# Altium footprint library PcbLib_ICs.PcbLib: 317 footprints (part 14 of 24)
Each footprint in its own frame and in the unit in brackets; x right, y up, seen from the top. Pads: shape width x height; smd on the part's side, far side on the other; paste and mask are expansions set on the pad; w line width, h text height; cw(c..) or ccw(c..) is an arc to the next point about the centre after c.
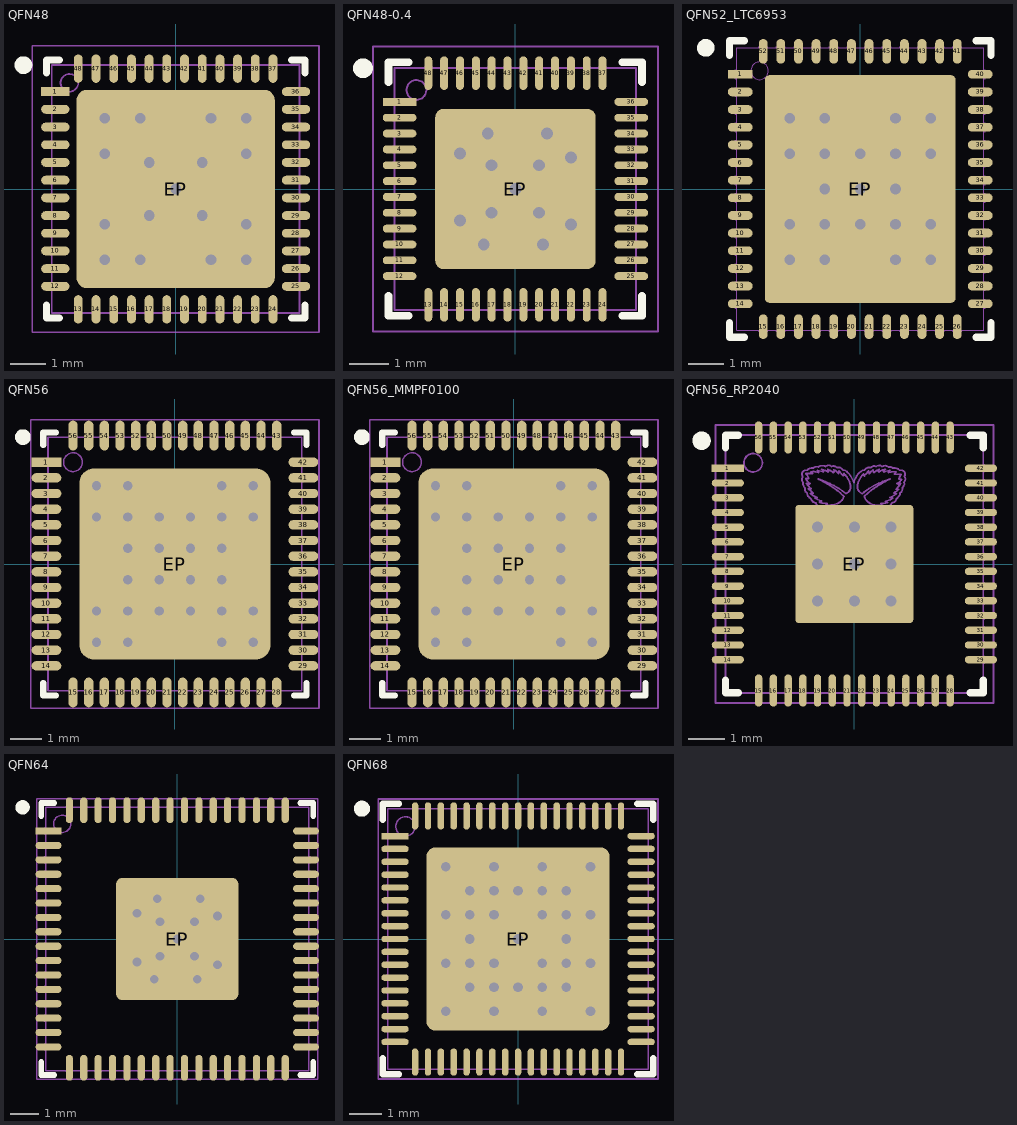
[diagram p13: the footprints below, top view; thin cyan lines are the x and y axes]

## QFN48 [mm] "QFN, 48-Leads, Body 6.95x6.95mm, Pitch 0.50mm, Thermal Pad 5.60x5.60mm, IPC Medium Density"
height 0.55
pads (49):
  rect 0.8x0.25 smd paste+0 mask+0.075: 1(-3.4,2.75)
  oval 0.8x0.25 smd paste+0 mask+0.075: 2(-3.4,2.25) 3(-3.4,1.75) 4(-3.4,1.25) 5(-3.4,0.75) 6(-3.4,0.25) 7(-3.4,-0.25) 8(-3.4,-0.75) 9(-3.4,-1.25) 10(-3.4,-1.75) 11(-3.4,-2.25) 12(-3.4,-2.75) 25(3.4,-2.75) 26(3.4,-2.25) 27(3.4,-1.75) 28(3.4,-1.25) 29(3.4,-0.75) 30(3.4,-0.25) 31(3.4,0.25) 32(3.4,0.75) 33(3.4,1.25) 34(3.4,1.75) 35(3.4,2.25) 36(3.4,2.75)
  oval 0.25x0.8 smd paste+0 mask+0.075: 13(-2.75,-3.4) 14(-2.25,-3.4) 15(-1.75,-3.4) 16(-1.25,-3.4) 17(-0.75,-3.4) 18(-0.25,-3.4) 19(0.25,-3.4) 20(0.75,-3.4) 21(1.25,-3.4) 22(1.75,-3.4) 23(2.25,-3.4) 24(2.75,-3.4) 37(2.75,3.4) 38(2.25,3.4) 39(1.75,3.4) 40(1.25,3.4) 41(0.75,3.4) 42(0.25,3.4) 43(-0.25,3.4) 44(-0.75,3.4) 45(-1.25,3.4) 46(-1.75,3.4) 47(-2.25,3.4) 48(-2.75,3.4)
  rrect10% 5.6x5.6 smd paste-50 mask+0.075: EP(0,0)
via -2,-1 diameter 0.7 hole 0.3
via -1,-2 diameter 0.7 hole 0.3
via 1,-2 diameter 0.7 hole 0.3
via 2,-1 diameter 0.7 hole 0.3
via 2,1 diameter 0.7 hole 0.3
via 1,2 diameter 0.7 hole 0.3
via -2,1 diameter 0.7 hole 0.3
via -1,2 diameter 0.7 hole 0.3
via 2,-2 diameter 0.7 hole 0.3
via 0.75,-0.75 diameter 0.7 hole 0.3
via -2,-2 diameter 0.7 hole 0.3
via -0.75,-0.75 diameter 0.7 hole 0.3
via -2,2 diameter 0.7 hole 0.3
via 0.75,0.75 diameter 0.7 hole 0.3
via 2,2 diameter 0.7 hole 0.3
via 0,0 diameter 0.7 hole 0.3
via -0.75,0.75 diameter 0.7 hole 0.3
Top Overlay:
  circle w0.25: c-4.3,3.5 r0.125
  lines w0.2: -3.65,-3.275 -3.65,-3.65 -3.275,-3.65 ; -3.65,3.275 -3.65,3.65 -3.275,3.65 ; 3.275,-3.65 3.65,-3.65 3.65,-3.275 ; 3.275,3.65 3.65,3.65 3.65,3.275
Top Paste:
  region: -2.2,-2.7 -2.2,-2.2 -2.7,-2.2 -2.7,-2.7
  region: -1.5,-2.7 -1.5,-2.2 -2,-2.2 -2,-2.7
  region: -0.8,-2.7 -0.8,-2.2 -1.3,-2.2 -1.3,-2.7
  region: 2.7,-2.7 2.7,-2.2 2.2,-2.2 2.2,-2.7
  region: 1.3,-2.7 1.3,-2.2 0.8,-2.2 0.8,-2.7
  region: 2,-2.7 2,-2.2 1.5,-2.2 1.5,-2.7
  region: -0.1,-2.7 -0.1,-2.2 -0.6,-2.2 -0.6,-2.7
  region: 0.6,-2.7 0.6,-2.2 0.1,-2.2 0.1,-2.7
  region: -2.2,-2 -2.2,-1.5 -2.7,-1.5 -2.7,-2
  region: -1.5,-2 -1.5,-1.5 -2,-1.5 -2,-2
  region: -0.8,-2 -0.8,-1.5 -1.3,-1.5 -1.3,-2
  region: 2.7,-2 2.7,-1.5 2.2,-1.5 2.2,-2
  region: 1.3,-2 1.3,-1.5 0.8,-1.5 0.8,-2
  region: 2,-2 2,-1.5 1.5,-1.5 1.5,-2
  region: -0.1,-2 -0.1,-1.5 -0.6,-1.5 -0.6,-2
  region: 0.6,-2 0.6,-1.5 0.1,-1.5 0.1,-2
  region: -2.2,-1.3 -2.2,-0.8 -2.7,-0.8 -2.7,-1.3
  region: -1.5,-1.3 -1.5,-0.8 -2,-0.8 -2,-1.3
  region: -0.8,-1.3 -0.8,-0.8 -1.3,-0.8 -1.3,-1.3
  region: 2.7,-1.3 2.7,-0.8 2.2,-0.8 2.2,-1.3
  region: 1.3,-1.3 1.3,-0.8 0.8,-0.8 0.8,-1.3
  region: 2,-1.3 2,-0.8 1.5,-0.8 1.5,-1.3
  region: -0.1,-1.3 -0.1,-0.8 -0.6,-0.8 -0.6,-1.3
  region: 0.6,-1.3 0.6,-0.8 0.1,-0.8 0.1,-1.3
  region: 2.2,2.7 2.2,2.2 2.7,2.2 2.7,2.7
  region: 1.5,2.7 1.5,2.2 2,2.2 2,2.7
  region: 0.8,2.7 0.8,2.2 1.3,2.2 1.3,2.7
  region: -2.7,2.7 -2.7,2.2 -2.2,2.2 -2.2,2.7
  region: -1.3,2.7 -1.3,2.2 -0.8,2.2 -0.8,2.7
  region: -2,2.7 -2,2.2 -1.5,2.2 -1.5,2.7
  region: 0.1,2.7 0.1,2.2 0.6,2.2 0.6,2.7
  region: -0.6,2.7 -0.6,2.2 -0.1,2.2 -0.1,2.7
  region: 2.2,2 2.2,1.5 2.7,1.5 2.7,2
  region: 1.5,2 1.5,1.5 2,1.5 2,2
  region: 0.8,2 0.8,1.5 1.3,1.5 1.3,2
  region: -2.7,2 -2.7,1.5 -2.2,1.5 -2.2,2
  region: -1.3,2 -1.3,1.5 -0.8,1.5 -0.8,2
  region: -2,2 -2,1.5 -1.5,1.5 -1.5,2
  region: 0.1,2 0.1,1.5 0.6,1.5 0.6,2
  region: -0.6,2 -0.6,1.5 -0.1,1.5 -0.1,2
  region: 2.2,1.3 2.2,0.8 2.7,0.8 2.7,1.3
  region: 1.5,1.3 1.5,0.8 2,0.8 2,1.3
  region: 0.8,1.3 0.8,0.8 1.3,0.8 1.3,1.3
  region: -2.7,1.3 -2.7,0.8 -2.2,0.8 -2.2,1.3
  region: -1.3,1.3 -1.3,0.8 -0.8,0.8 -0.8,1.3
  region: -2,1.3 -2,0.8 -1.5,0.8 -1.5,1.3
  region: 0.1,1.3 0.1,0.8 0.6,0.8 0.6,1.3
  region: -0.6,1.3 -0.6,0.8 -0.1,0.8 -0.1,1.3
  region: 2.7,-0.6 2.7,-0.1 2.2,-0.1 2.2,-0.6
  region: 2.2,0.6 2.2,0.1 2.7,0.1 2.7,0.6
  region: 2,-0.6 2,-0.1 1.5,-0.1 1.5,-0.6
  region: 1.5,0.6 1.5,0.1 2,0.1 2,0.6
  region: 1.3,-0.6 1.3,-0.1 0.8,-0.1 0.8,-0.6
  region: 0.8,0.6 0.8,0.1 1.3,0.1 1.3,0.6
  region: -2.7,0.6 -2.7,0.1 -2.2,0.1 -2.2,0.6
  region: -2.2,-0.6 -2.2,-0.1 -2.7,-0.1 -2.7,-0.6
  region: -1.3,0.6 -1.3,0.1 -0.8,0.1 -0.8,0.6
  region: -2,0.6 -2,0.1 -1.5,0.1 -1.5,0.6
  region: -1.5,-0.6 -1.5,-0.1 -2,-0.1 -2,-0.6
  region: -0.8,-0.6 -0.8,-0.1 -1.3,-0.1 -1.3,-0.6
  region: 0.1,0.6 0.1,0.1 0.6,0.1 0.6,0.6
  region: -0.6,0.6 -0.6,0.1 -0.1,0.1 -0.1,0.6
  region: -0.1,-0.6 -0.1,-0.1 -0.6,-0.1 -0.6,-0.6
  region: 0.6,-0.6 0.6,-0.1 0.1,-0.1 0.1,-0.6
Bottom Solder:
  region: -3,3 -0.75,3 0,2.25 0.75,3 3,3 3,0.75 2.25,0 3,-0.75 3,-3 0.75,-3 0,-2.25 -0.75,-3 -3,-3 -3,-0.75 -2.25,0 -3,0.75
Top Assy:
  circle w0.05: c-3,3 r0.25
  lines w0.05: -3.517,-2.85 -3.54,-2.85 -3.54,-2.65 -3.517,-2.65 ; -3.517,-2.35 -3.54,-2.35 -3.54,-2.15 -3.517,-2.15 ; -3.517,-1.85 -3.54,-1.85 -3.54,-1.65 -3.517,-1.65 ; -3.517,-1.35 -3.54,-1.35 -3.54,-1.15 -3.517,-1.15 ; -3.517,-0.85 -3.54,-0.85 -3.54,-0.65 -3.517,-0.65 ; -3.517,-0.35 -3.54,-0.35 -3.54,-0.15 -3.517,-0.15 ; -3.517,0.15 -3.54,0.15 -3.54,0.35 -3.517,0.35 ; -3.517,0.65 -3.54,0.65 -3.54,0.85 -3.517,0.85 ; -3.517,1.15 -3.54,1.15 -3.54,1.35 -3.517,1.35 ; -3.517,1.65 -3.54,1.65 -3.54,1.85 -3.517,1.85 ; -3.517,2.15 -3.54,2.15 -3.54,2.35 -3.517,2.35 ; -3.517,2.65 -3.54,2.65 -3.54,2.85 -3.517,2.85 ; -2.85,-3.517 -2.85,-3.54 -2.65,-3.54 -2.65,-3.517 ; -2.85,3.517 -2.85,3.54 -2.65,3.54 -2.65,3.517 ; -2.35,-3.517 -2.35,-3.54 -2.15,-3.54 -2.15,-3.517 ; -2.35,3.517 -2.35,3.54 -2.15,3.54 -2.15,3.517 ; -1.85,-3.517 -1.85,-3.54 -1.65,-3.54 -1.65,-3.517 ; -1.85,3.517 -1.85,3.54 -1.65,3.54 -1.65,3.517 ; -1.35,-3.517 -1.35,-3.54 -1.15,-3.54 -1.15,-3.517 ; -1.35,3.517 -1.35,3.54 -1.15,3.54 -1.15,3.517 ; -0.85,-3.517 -0.85,-3.54 -0.65,-3.54 -0.65,-3.517 ; -0.85,3.517 -0.85,3.54 -0.65,3.54 -0.65,3.517 ; -0.35,-3.517 -0.35,-3.54 -0.15,-3.54 -0.15,-3.517 ; -0.35,3.517 -0.35,3.54 -0.15,3.54 -0.15,3.517 ; 0.15,-3.517 0.15,-3.54 0.35,-3.54 0.35,-3.517 ; 0.15,3.517 0.15,3.54 0.35,3.54 0.35,3.517 ; 0.65,-3.517 0.65,-3.54 0.85,-3.54 0.85,-3.517 ; 0.65,3.517 0.65,3.54 0.85,3.54 0.85,3.517 ; 1.15,-3.517 1.15,-3.54 1.35,-3.54 1.35,-3.517 ; 1.15,3.517 1.15,3.54 1.35,3.54 1.35,3.517 ; 1.65,-3.517 1.65,-3.54 1.85,-3.54 1.85,-3.517 ; 1.65,3.517 1.65,3.54 1.85,3.54 1.85,3.517 ; 2.15,-3.517 2.15,-3.54 2.35,-3.54 2.35,-3.517 ; 2.15,3.517 2.15,3.54 2.35,3.54 2.35,3.517 ; 2.65,-3.517 2.65,-3.54 2.85,-3.54 2.85,-3.517 ; 2.65,3.517 2.65,3.54 2.85,3.54 2.85,3.517 ; 3.517,-2.85 3.54,-2.85 3.54,-2.65 3.517,-2.65 ; 3.517,-2.35 3.54,-2.35 3.54,-2.15 3.517,-2.15 ; 3.517,-1.85 3.54,-1.85 3.54,-1.65 3.517,-1.65 ; 3.517,-1.35 3.54,-1.35 3.54,-1.15 3.517,-1.15 ; 3.517,-0.85 3.54,-0.85 3.54,-0.65 3.517,-0.65 ; 3.517,-0.35 3.54,-0.35 3.54,-0.15 3.517,-0.15 ; 3.517,0.15 3.54,0.15 3.54,0.35 3.517,0.35 ; 3.517,0.65 3.54,0.65 3.54,0.85 3.517,0.85 ; 3.517,1.15 3.54,1.15 3.54,1.35 3.517,1.35 ; 3.517,1.65 3.54,1.65 3.54,1.85 3.517,1.85 ; 3.517,2.15 3.54,2.15 3.54,2.35 3.517,2.35 ; 3.517,2.65 3.54,2.65 3.54,2.85 3.517,2.85 ; -3.5,-3.5 3.5,-3.5 3.5,3.5 -3.5,3.5 -3.5,-3.5
  text ".Designator" at -3.443,-0.467 h2
Top Text:
  lines w0.05: -4.05,-4.05 4.05,-4.05 4.05,4.05 -4.05,4.05 -4.05,-4.05
  lines w0.1: -0.5,0 0.5,0 ; 0,-0.5 0,0.5
3D body "QFN50P695X695X55_HS-49N.step": height 0.55, standoff 0, extent -3.52,-3.52 3.52,3.52

## QFN48-0.4 [mm] "QFN48 package 6x6 mm with 0.4mm pitch"
height 1
pads (49):
  rect 0.85x0.2 smd paste+0 mask+0.05: 1(-2.925,2.2)
  oval 0.85x0.2 smd paste+0 mask+0.05: 2(-2.925,1.8) 3(-2.925,1.4) 4(-2.925,1) 5(-2.925,0.6) 6(-2.925,0.2) 7(-2.925,-0.2) 8(-2.925,-0.6) 9(-2.925,-1) 10(-2.925,-1.4) 11(-2.925,-1.8) 12(-2.925,-2.2) 25(2.925,-2.2) 26(2.925,-1.8) 27(2.925,-1.4) 28(2.925,-1) 29(2.925,-0.6) 30(2.925,-0.2) 31(2.925,0.2) 32(2.925,0.6) 33(2.925,1) 34(2.925,1.4) 35(2.925,1.8) 36(2.925,2.2)
  oval 0.2x0.85 smd paste+0 mask+0.05: 13(-2.2,-2.925) 14(-1.8,-2.925) 15(-1.4,-2.925) 16(-1,-2.925) 17(-0.6,-2.925) 18(-0.2,-2.925) 19(0.2,-2.925) 20(0.6,-2.925) 21(1,-2.925) 22(1.4,-2.925) 23(1.8,-2.925) 24(2.2,-2.925) 37(2.2,2.925) 38(1.8,2.925) 39(1.4,2.925) 40(1,2.925) 41(0.6,2.925) 42(0.2,2.925) 43(-0.2,2.925) 44(-0.6,2.925) 45(-1,2.925) 46(-1.4,2.925) 47(-1.8,2.925) 48(-2.2,2.925)
  rrect10% 4.05x4.05 smd paste-50 mask+0.05: EP(0,0)
via 0,0 diameter 0.7 hole 0.3
via -0.6,0.6 diameter 0.7 hole 0.3
via 0.6,0.6 diameter 0.7 hole 0.3
via 0.8,1.4 diameter 0.7 hole 0.3
via 1.4,0.8 diameter 0.7 hole 0.3
via -0.7,1.4 diameter 0.7 hole 0.3
via -1.4,0.9 diameter 0.7 hole 0.3
via 1.4,-0.9 diameter 0.7 hole 0.3
via 0.7,-1.4 diameter 0.7 hole 0.3
via -1.4,-0.8 diameter 0.7 hole 0.3
via -0.8,-1.4 diameter 0.7 hole 0.3
via -0.6,-0.6 diameter 0.7 hole 0.3
via 0.6,-0.6 diameter 0.7 hole 0.3
Top Overlay:
  circle w0.25: c-3.85,3.05 r0.125
  lines w0.2: -3.2,-2.7 -3.2,-3.2 -2.7,-3.2 ; -3.2,2.7 -3.2,3.2 -2.7,3.2 ; 2.7,-3.2 3.2,-3.2 3.2,-2.7 ; 2.7,3.2 3.2,3.2 3.2,2.7
Top Paste:
  region: 1.5,2 1.5,1.5 2,1.5 2,2
  region: 0.8,2 0.8,1.5 1.3,1.5 1.3,2
  region: 0.1,2 0.1,1.5 0.6,1.5 0.6,2
  region: -0.6,2 -0.6,1.5 -0.1,1.5 -0.1,2
  region: -1.3,2 -1.3,1.5 -0.8,1.5 -0.8,2
  region: -2,2 -2,1.5 -1.5,1.5 -1.5,2
  region: 1.5,1.3 1.5,0.8 2,0.8 2,1.3
  region: 0.8,1.3 0.8,0.8 1.3,0.8 1.3,1.3
  region: 0.1,1.3 0.1,0.8 0.6,0.8 0.6,1.3
  region: -0.6,1.3 -0.6,0.8 -0.1,0.8 -0.1,1.3
  region: -1.3,1.3 -1.3,0.8 -0.8,0.8 -0.8,1.3
  region: -2,1.3 -2,0.8 -1.5,0.8 -1.5,1.3
  region: -1.5,-2 -1.5,-1.5 -2,-1.5 -2,-2
  region: -0.8,-2 -0.8,-1.5 -1.3,-1.5 -1.3,-2
  region: -0.1,-2 -0.1,-1.5 -0.6,-1.5 -0.6,-2
  region: 0.6,-2 0.6,-1.5 0.1,-1.5 0.1,-2
  region: 1.3,-2 1.3,-1.5 0.8,-1.5 0.8,-2
  region: 2,-2 2,-1.5 1.5,-1.5 1.5,-2
  region: -1.5,-1.3 -1.5,-0.8 -2,-0.8 -2,-1.3
  region: -0.8,-1.3 -0.8,-0.8 -1.3,-0.8 -1.3,-1.3
  region: -0.1,-1.3 -0.1,-0.8 -0.6,-0.8 -0.6,-1.3
  region: 0.6,-1.3 0.6,-0.8 0.1,-0.8 0.1,-1.3
  region: 1.3,-1.3 1.3,-0.8 0.8,-0.8 0.8,-1.3
  region: 2,-1.3 2,-0.8 1.5,-0.8 1.5,-1.3
  region: 1.5,0.6 1.5,0.1 2,0.1 2,0.6
  region: 0.8,0.6 0.8,0.1 1.3,0.1 1.3,0.6
  region: 0.1,0.6 0.1,0.1 0.6,0.1 0.6,0.6
  region: -0.6,0.6 -0.6,0.1 -0.1,0.1 -0.1,0.6
  region: -1.3,0.6 -1.3,0.1 -0.8,0.1 -0.8,0.6
  region: -2,0.6 -2,0.1 -1.5,0.1 -1.5,0.6
  region: -1.5,-0.6 -1.5,-0.1 -2,-0.1 -2,-0.6
  region: -0.8,-0.6 -0.8,-0.1 -1.3,-0.1 -1.3,-0.6
  region: -0.1,-0.6 -0.1,-0.1 -0.6,-0.1 -0.6,-0.6
  region: 0.6,-0.6 0.6,-0.1 0.1,-0.1 0.1,-0.6
  region: 1.3,-0.6 1.3,-0.1 0.8,-0.1 0.8,-0.6
  region: 2,-0.6 2,-0.1 1.5,-0.1 1.5,-0.6
Bottom Solder:
  region: -2.2,2.2 -0.4,2.2 0,1.8 0.4,2.2 2.2,2.2 2.2,0.4 1.8,0 2.2,-0.4 2.2,-2.2 0.4,-2.2 0,-1.8 -0.4,-2.2 -2.2,-2.2 -2.2,-0.4 -1.8,0 -2.2,0.4
Top Assy:
  circle w0.05: c-2.5,2.5 r0.25
  lines w0.05: -3.062,-2.275 -3.095,-2.275 -3.095,-2.125 -3.062,-2.125 ; -3.062,-1.875 -3.095,-1.875 -3.095,-1.725 -3.062,-1.725 ; -3.062,-1.475 -3.095,-1.475 -3.095,-1.325 -3.062,-1.325 ; -3.062,-1.075 -3.095,-1.075 -3.095,-0.925 -3.062,-0.925 ; -3.062,-0.675 -3.095,-0.675 -3.095,-0.525 -3.062,-0.525 ; -3.062,-0.275 -3.095,-0.275 -3.095,-0.125 -3.062,-0.125 ; -3.062,0.125 -3.095,0.125 -3.095,0.275 -3.062,0.275 ; -3.062,0.525 -3.095,0.525 -3.095,0.675 -3.062,0.675 ; -3.062,0.925 -3.095,0.925 -3.095,1.075 -3.062,1.075 ; -3.062,1.325 -3.095,1.325 -3.095,1.475 -3.062,1.475 ; -3.062,1.725 -3.095,1.725 -3.095,1.875 -3.062,1.875 ; -3.062,2.125 -3.095,2.125 -3.095,2.275 -3.062,2.275 ; -2.275,-3.062 -2.275,-3.095 -2.125,-3.095 -2.125,-3.062 ; -2.275,3.062 -2.275,3.095 -2.125,3.095 -2.125,3.062 ; -1.875,-3.062 -1.875,-3.095 -1.725,-3.095 -1.725,-3.062 ; -1.875,3.062 -1.875,3.095 -1.725,3.095 -1.725,3.062 ; -1.475,-3.062 -1.475,-3.095 -1.325,-3.095 -1.325,-3.062 ; -1.475,3.062 -1.475,3.095 -1.325,3.095 -1.325,3.062 ; -1.075,-3.062 -1.075,-3.095 -0.925,-3.095 -0.925,-3.062 ; -1.075,3.062 -1.075,3.095 -0.925,3.095 -0.925,3.062 ; -0.675,-3.062 -0.675,-3.095 -0.525,-3.095 -0.525,-3.062 ; -0.675,3.062 -0.675,3.095 -0.525,3.095 -0.525,3.062 ; -0.275,-3.062 -0.275,-3.095 -0.125,-3.095 -0.125,-3.062 ; -0.275,3.062 -0.275,3.095 -0.125,3.095 -0.125,3.062 ; 0.125,-3.062 0.125,-3.095 0.275,-3.095 0.275,-3.062 ; 0.125,3.062 0.125,3.095 0.275,3.095 0.275,3.062 ; 0.525,-3.062 0.525,-3.095 0.675,-3.095 0.675,-3.062 ; 0.525,3.062 0.525,3.095 0.675,3.095 0.675,3.062 ; 0.925,-3.062 0.925,-3.095 1.075,-3.095 1.075,-3.062 ; 0.925,3.062 0.925,3.095 1.075,3.095 1.075,3.062 ; 1.325,-3.062 1.325,-3.095 1.475,-3.095 1.475,-3.062 ; 1.325,3.062 1.325,3.095 1.475,3.095 1.475,3.062 ; 1.725,-3.062 1.725,-3.095 1.875,-3.095 1.875,-3.062 ; 1.725,3.062 1.725,3.095 1.875,3.095 1.875,3.062 ; 2.125,-3.062 2.125,-3.095 2.275,-3.095 2.275,-3.062 ; 2.125,3.062 2.125,3.095 2.275,3.095 2.275,3.062 ; 3.062,-2.275 3.095,-2.275 3.095,-2.125 3.062,-2.125 ; 3.062,-1.875 3.095,-1.875 3.095,-1.725 3.062,-1.725 ; 3.062,-1.475 3.095,-1.475 3.095,-1.325 3.062,-1.325 ; 3.062,-1.075 3.095,-1.075 3.095,-0.925 3.062,-0.925 ; 3.062,-0.675 3.095,-0.675 3.095,-0.525 3.062,-0.525 ; 3.062,-0.275 3.095,-0.275 3.095,-0.125 3.062,-0.125 ; 3.062,0.125 3.095,0.125 3.095,0.275 3.062,0.275 ; 3.062,0.525 3.095,0.525 3.095,0.675 3.062,0.675 ; 3.062,0.925 3.095,0.925 3.095,1.075 3.062,1.075 ; 3.062,1.325 3.095,1.325 3.095,1.475 3.062,1.475 ; 3.062,1.725 3.095,1.725 3.095,1.875 3.062,1.875 ; 3.062,2.125 3.095,2.125 3.095,2.275 3.062,2.275 ; -3.05,-3.05 -3.05,3.05 3.05,3.05 3.05,-3.05 -3.05,-3.05
  text ".Designator" at -3.443,-0.467 h2
Top Text:
  lines w0.05: -3.6,-3.6 -3.6,3.6 3.6,3.6 3.6,-3.6 -3.6,-3.6
  lines w0.1: -0.5,0 0.5,0 ; 0,-0.5 0,0.5
3D body "QFN48-0.4.step": height 1, standoff 0, extent -3.13,-3.13 3.13,3.13

## QFN52_LTC6953 [mm]
pads (53):
  rect 0.7x0.25 smd paste+0 mask+0.05: 1(-3.4,3.25)
  oval 0.7x0.25 smd paste+0 mask+0.05: 2(-3.4,2.75) 3(-3.4,2.25) 4(-3.4,1.75) 5(-3.4,1.25) 6(-3.4,0.75) 7(-3.4,0.25) 8(-3.4,-0.25) 9(-3.4,-0.75) 10(-3.4,-1.25) 11(-3.4,-1.75) 12(-3.4,-2.25) 13(-3.4,-2.75) 14(-3.4,-3.25) 27(3.4,-3.25) 28(3.4,-2.75) 29(3.4,-2.25) 30(3.4,-1.75) 31(3.4,-1.25) 32(3.4,-0.75) 33(3.4,-0.25) 34(3.4,0.25) 35(3.4,0.75) 36(3.4,1.25) 37(3.4,1.75) 38(3.4,2.25) 39(3.4,2.75) 40(3.4,3.25)
  oval 0.25x0.7 smd paste+0 mask+0.05: 15(-2.75,-3.9) 16(-2.25,-3.9) 17(-1.75,-3.9) 18(-1.25,-3.9) 19(-0.75,-3.9) 20(-0.25,-3.9) 21(0.25,-3.9) 22(0.75,-3.9) 23(1.25,-3.9) 24(1.75,-3.9) 25(2.25,-3.9) 26(2.75,-3.9) 41(2.75,3.9) 42(2.25,3.9) 43(1.75,3.9) 44(1.25,3.9) 45(0.75,3.9) 46(0.25,3.9) 47(-0.25,3.9) 48(-0.75,3.9) 49(-1.25,3.9) 50(-1.75,3.9) 51(-2.25,3.9) 52(-2.75,3.9)
  rrect5% 5.41x6.45 smd paste-10 mask+0.05: EP(0,0)
via 0,0 diameter 0.7 hole 0.3
via -1,1 diameter 0.7 hole 0.3
via -2,1 diameter 0.7 hole 0.3
via -2,2 diameter 0.7 hole 0.3
via -1,2 diameter 0.7 hole 0.3
via 1,1 diameter 0.7 hole 0.3
via 1,2 diameter 0.7 hole 0.3
via 2,2 diameter 0.7 hole 0.3
via 2,1 diameter 0.7 hole 0.3
via 1,-1 diameter 0.7 hole 0.3
via 2,-1 diameter 0.7 hole 0.3
via 2,-2 diameter 0.7 hole 0.3
via 1,-2 diameter 0.7 hole 0.3
via -1,-1 diameter 0.7 hole 0.3
via -1,-2 diameter 0.7 hole 0.3
via -2,-2 diameter 0.7 hole 0.3
via -2,-1 diameter 0.7 hole 0.3
via -1,0 diameter 0.7 hole 0.3
via 1,0 diameter 0.7 hole 0.3
via 0,1 diameter 0.7 hole 0.3
via 0,-1 diameter 0.7 hole 0.3
Top Overlay:
  circle w0.25: c-4.375,4 r0.125
  lines w0.2: -3.7,-3.785 -3.7,-4.2 -3.285,-4.2 ; -3.7,3.785 -3.7,4.2 -3.285,4.2 ; 3.285,-4.2 3.7,-4.2 3.7,-3.785 ; 3.285,4.2 3.7,4.2 3.7,3.785
Top Paste:
  rectangle: -1.9,-1.25 -1.35,-0.7
  rectangle: -1.25,-1.25 -0.7,-0.7
  rectangle: -0.6,-1.25 -0.05,-0.7
  rectangle: 0.05,-1.25 0.6,-0.7
  rectangle: 0.7,-1.25 1.25,-0.7
  rectangle: 1.35,-1.25 1.9,-0.7
  rectangle: 1.35,-1.9 1.9,-1.35
  rectangle: 0.7,-1.9 1.25,-1.35
  rectangle: 0.05,-1.9 0.6,-1.35
  rectangle: -0.6,-1.9 -0.05,-1.35
  rectangle: -1.25,-1.9 -0.7,-1.35
  rectangle: -1.9,-1.9 -1.35,-1.35
  rectangle: -1.9,0.05 -1.35,0.6
  rectangle: -1.25,0.05 -0.7,0.6
  rectangle: -0.6,0.05 -0.05,0.6
  rectangle: 0.05,0.05 0.6,0.6
  rectangle: 0.7,0.05 1.25,0.6
  rectangle: 1.35,0.05 1.9,0.6
  rectangle: 1.35,-0.6 1.9,-0.05
  rectangle: 0.7,-0.6 1.25,-0.05
  rectangle: 0.05,-0.6 0.6,-0.05
  rectangle: -0.6,-0.6 -0.05,-0.05
  rectangle: -1.25,-0.6 -0.7,-0.05
  rectangle: -1.9,-0.6 -1.35,-0.05
  rectangle: -1.9,0.7 -1.35,1.25
  rectangle: -1.25,0.7 -0.7,1.25
  rectangle: -0.6,0.7 -0.05,1.25
  rectangle: 0.05,0.7 0.6,1.25
  rectangle: 0.7,0.7 1.25,1.25
  rectangle: 1.35,0.7 1.9,1.25
  rectangle: 1.35,1.35 1.9,1.9
  rectangle: 0.7,1.35 1.25,1.9
  rectangle: 0.05,1.35 0.6,1.9
  rectangle: -0.6,1.35 -0.05,1.9
  rectangle: -1.25,1.35 -0.7,1.9
  rectangle: -1.9,1.35 -1.35,1.9
  rectangle: -2.55,1.35 -2,1.9
  rectangle: -2.55,0.7 -2,1.25
  rectangle: -2.55,0.05 -2,0.6
  rectangle: -2.55,-0.6 -2,-0.05
  rectangle: -2.55,-1.25 -2,-0.7
  rectangle: -2.55,-1.9 -2,-1.35
  rectangle: 2,-1.25 2.55,-0.7
  rectangle: 2,-1.9 2.55,-1.35
  rectangle: 2,0.05 2.55,0.6
  rectangle: 2,-0.6 2.55,-0.05
  rectangle: 2,0.7 2.55,1.25
  rectangle: 2,1.35 2.55,1.9
  rectangle: -1.9,2 -1.35,2.55
  rectangle: -1.25,2 -0.7,2.55
  rectangle: -0.6,2 -0.05,2.55
  rectangle: 0.05,2 0.6,2.55
  rectangle: 0.7,2 1.25,2.55
  rectangle: 1.35,2 1.9,2.55
  rectangle: 1.35,2.65 1.9,3.2
  rectangle: 0.7,2.65 1.25,3.2
  rectangle: 0.05,2.65 0.6,3.2
  rectangle: -0.6,2.65 -0.05,3.2
  rectangle: -1.25,2.65 -0.7,3.2
  rectangle: -1.9,2.65 -1.35,3.2
  rectangle: -2.55,2.65 -2,3.2
  rectangle: -2.55,2 -2,2.55
  rectangle: 2,2 2.55,2.55
  rectangle: 2,2.65 2.55,3.2
  rectangle: -1.9,-2.55 -1.35,-2
  rectangle: -1.25,-2.55 -0.7,-2
  rectangle: -0.6,-2.55 -0.05,-2
  rectangle: 0.05,-2.55 0.6,-2
  rectangle: 0.7,-2.55 1.25,-2
  rectangle: 1.35,-2.55 1.9,-2
  rectangle: 1.35,-3.2 1.9,-2.65
  rectangle: 0.7,-3.2 1.25,-2.65
  rectangle: 0.05,-3.2 0.6,-2.65
  rectangle: -0.6,-3.2 -0.05,-2.65
  rectangle: -1.25,-3.2 -0.7,-2.65
  rectangle: -1.9,-3.2 -1.35,-2.65
  rectangle: -2.55,-2.55 -2,-2
  rectangle: -2.55,-3.2 -2,-2.65
  rectangle: 2,-2.55 2.55,-2
  rectangle: 2,-3.2 2.55,-2.65
Bottom Solder:
  region: -2.75,3.25 -0.5,3.25 0,2.75 0.5,3.25 2.75,3.25 2.75,0.75 2.25,0.25 2.75,-0.25 2.749,-3.25 0.5,-3.25 0,-2.75 -0.5,-3.25 -2.75,-3.25 -2.75,-0.25 -2.25,0.25 -2.75,0.75
Top Assy:
  drawing of 546 lines, arcs and shapes, not listed
  text ".Designator" at -3.443,-1.717 h2
Top Text:
  lines w0.1: -0.5,0 0.5,0 ; 0,-0.5 0,0.5
3D body "QFN-54(7x8).STEP": height 0.74, standoff -0.01, extent -3.535,-4.035 3.535,4.035

## QFN56 [mm] "QFN56 package, 8x8mm, 0.5mm pitch"
height 0.9
pads (57):
  rect 0.95x0.3 smd paste+0 mask+0.075: 1(-4.1,3.25)
  oval 0.95x0.3 smd paste+0 mask+0.075: 2(-4.1,2.75) 3(-4.1,2.25) 4(-4.1,1.75) 5(-4.1,1.25) 6(-4.1,0.75) 7(-4.1,0.25) 8(-4.1,-0.25) 9(-4.1,-0.75) 10(-4.1,-1.25) 11(-4.1,-1.75) 12(-4.1,-2.25) 13(-4.1,-2.75) 14(-4.1,-3.25) 29(4.1,-3.25) 30(4.1,-2.75) 31(4.1,-2.25) 32(4.1,-1.75) 33(4.1,-1.25) 34(4.1,-0.75) 35(4.1,-0.25) 36(4.1,0.25) 37(4.1,0.75) 38(4.1,1.25) 39(4.1,1.75) 40(4.1,2.25) 41(4.1,2.75) 42(4.1,3.25)
  oval 0.3x0.95 smd paste+0 mask+0.075: 15(-3.25,-4.1) 16(-2.75,-4.1) 17(-2.25,-4.1) 18(-1.75,-4.1) 19(-1.25,-4.1) 20(-0.75,-4.1) 21(-0.25,-4.1) 22(0.25,-4.1) 23(0.75,-4.1) 24(1.25,-4.1) 25(1.75,-4.1) 26(2.25,-4.1) 27(2.75,-4.1) 28(3.25,-4.1) 43(3.25,4.1) 44(2.75,4.1) 45(2.25,4.1) 46(1.75,4.1) 47(1.25,4.1) 48(0.75,4.1) 49(0.25,4.1) 50(-0.25,4.1) 51(-0.75,4.1) 52(-1.25,4.1) 53(-1.75,4.1) 54(-2.25,4.1) 55(-2.75,4.1) 56(-3.25,4.1)
  rrect15% 6.1x6.1 smd paste-50 mask+0.075: EP(0,0)
via -0.5,-0.5 diameter 0.7 hole 0.3
via 0.5,-0.5 diameter 0.7 hole 0.3
via 0.5,0.5 diameter 0.7 hole 0.3
via -0.5,0.5 diameter 0.7 hole 0.3
via 0.5,-1.5 diameter 0.7 hole 0.3
via -0.5,-1.5 diameter 0.7 hole 0.3
via 1.5,0.5 diameter 0.7 hole 0.3
via 1.5,-0.5 diameter 0.7 hole 0.3
via -1.5,-0.5 diameter 0.7 hole 0.3
via -1.5,0.5 diameter 0.7 hole 0.3
via 0.5,1.5 diameter 0.7 hole 0.3
via -0.5,1.5 diameter 0.7 hole 0.3
via 1.5,-2.5 diameter 0.7 hole 0.3
via 1.5,-1.5 diameter 0.7 hole 0.3
via 2.5,-2.5 diameter 0.7 hole 0.3
via 2.5,-1.5 diameter 0.7 hole 0.3
via -2.5,-1.5 diameter 0.7 hole 0.3
via -1.5,-1.5 diameter 0.7 hole 0.3
via -2.5,-2.5 diameter 0.7 hole 0.3
via -1.5,-2.5 diameter 0.7 hole 0.3
via -1.5,2.5 diameter 0.7 hole 0.3
via -1.5,1.5 diameter 0.7 hole 0.3
via -2.5,2.5 diameter 0.7 hole 0.3
via -2.5,1.5 diameter 0.7 hole 0.3
via 1.5,2.5 diameter 0.7 hole 0.3
via 2.5,2.5 diameter 0.7 hole 0.3
via 1.5,1.5 diameter 0.7 hole 0.3
via 2.5,1.5 diameter 0.7 hole 0.3
Top Overlay:
  circle w0.25: c-4.85,4.05 r0.125
  lines w0.2: -4.2,-3.8 -4.2,-4.2 -3.8,-4.2 ; -4.2,3.8 -4.2,4.2 -3.8,4.2 ; 3.8,-4.2 4.2,-4.2 4.2,-3.8 ; 3.8,4.2 4.2,4.2 4.2,3.8
Top Paste:
  region: -2,0.6 -2,0.1 -1.5,0.1 -1.5,0.6
  region: -1.3,0.6 -1.3,0.1 -0.8,0.1 -0.8,0.6
  region: -0.6,0.6 -0.6,0.1 -0.1,0.1 -0.1,0.6
  region: 0.1,0.6 0.1,0.1 0.6,0.1 0.6,0.6
  region: 0.8,0.6 0.8,0.1 1.3,0.1 1.3,0.6
  region: 1.5,0.6 1.5,0.1 2,0.1 2,0.6